# Altium footprint library LukaLIBRARY.PcbLib: 784 footprints (part 30 of 49)
Each footprint in its own frame and in the unit in brackets; x right, y up, seen from the top. Pads: shape width x height; smd on the part's side, far side on the other; paste and mask are expansions set on the pad; w line width, h text height; cw(c..) or ccw(c..) is an arc to the next point about the centre after c.
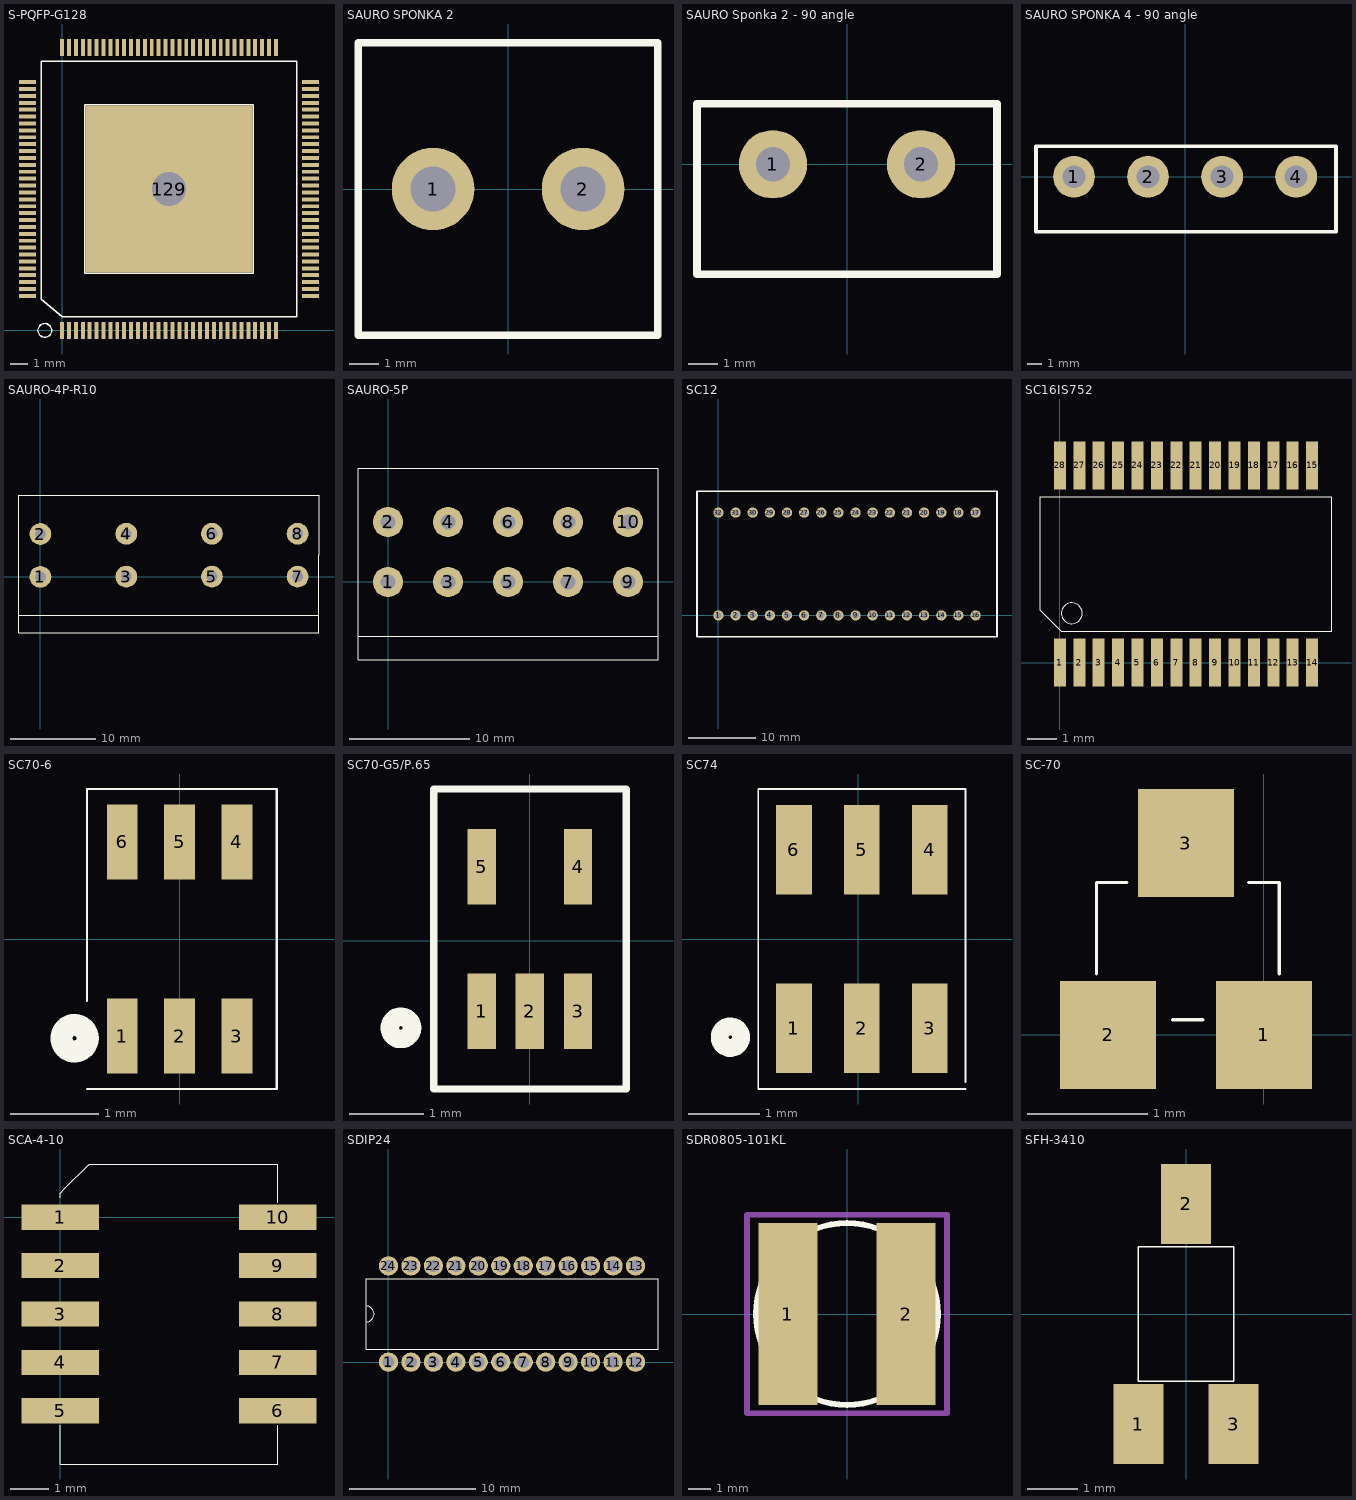
[diagram p29: the footprints below, top view; thin cyan lines are the x and y axes]

## S-PQFP-G128 [mm]
pads (129):
  rect 0.229x1 smd mask-25.4: 1(0,0) 2(0.4,0) 3(0.8,0) 4(1.2,0) 5(1.6,0) 6(2,0) 7(2.4,0) 8(2.8,0) 9(3.2,0) 10(3.6,0) 11(4,0) 12(4.4,0) 13(4.8,0) 14(5.2,0) 15(5.6,0) 16(6,0) 17(6.4,0) 18(6.8,0) 19(7.2,0) 20(7.6,0) 21(8,0) 22(8.4,0) 23(8.8,0) 24(9.2,0) 25(9.6,0) 26(10,0) 27(10.4,0) 28(10.8,0) 29(11.2,0) 30(11.6,0) 31(12,0) 32(12.4,0) 65(12.4,16.4) 66(12,16.4) 67(11.6,16.4) 68(11.2,16.4) 69(10.8,16.4) 70(10.4,16.4) 71(10,16.4) 72(9.6,16.4) 73(9.2,16.4) 74(8.8,16.4) 75(8.4,16.4) 76(8,16.4) 77(7.6,16.4) 78(7.2,16.4) 79(6.8,16.4) 80(6.4,16.4) 81(6,16.4) 82(5.6,16.4) 83(5.2,16.4) 84(4.8,16.4) 85(4.4,16.4) 86(4,16.4) 87(3.6,16.4) 88(3.2,16.4) 89(2.8,16.4) 90(2.4,16.4) 91(2,16.4) 92(1.6,16.4) 93(1.2,16.4) 94(0.8,16.4) 95(0.4,16.4) 96(0,16.4)
  rect 1x0.229 smd mask-25.4: 33(14.4,2) 34(14.4,2.4) 35(14.4,2.8) 36(14.4,3.2) 37(14.4,3.6) 38(14.4,4) 39(14.4,4.4) 40(14.4,4.8) 41(14.4,5.2) 42(14.4,5.6) 43(14.4,6) 44(14.4,6.4) 45(14.4,6.8) 46(14.4,7.2) 47(14.4,7.6) 48(14.4,8) 49(14.4,8.4) 50(14.4,8.8) 51(14.4,9.2) 52(14.4,9.6) 53(14.4,10) 54(14.4,10.4) 55(14.4,10.8) 56(14.4,11.2) 57(14.4,11.6) 58(14.4,12) 59(14.4,12.4) 60(14.4,12.8) 61(14.4,13.2) 62(14.4,13.6) 63(14.4,14) 64(14.4,14.4) 97(-2,14.4) 98(-2,14) 99(-2,13.6) 100(-2,13.2) 101(-2,12.8) 102(-2,12.4) 103(-2,12) 104(-2,11.6) 105(-2,11.2) 106(-2,10.8) 107(-2,10.4) 108(-2,10) 109(-2,9.6) 110(-2,9.2) 111(-2,8.8) 112(-2,8.4) 113(-2,8) 114(-2,7.6) 115(-2,7.2) 116(-2,6.8) 117(-2,6.4) 118(-2,6) 119(-2,5.6) 120(-2,5.2) 121(-2,4.8) 122(-2,4.4) 123(-2,4) 124(-2,3.6) 125(-2,3.2) 126(-2,2.8) 127(-2,2.4) 128(-2,2)
  rect 9.7x9.7 hole 2 unplated mask-25.4: 129(6.2,8.2)
Top Overlay:
  circle w0.076: c-1,0 r0.4
  lines w0.076: -1.2,1.8 0,0.8 13.6,0.8 13.6,15.6 -1.2,15.6 -1.2,1.8 ; 1.3,3.3 1.3,13.1 11.1,13.1 11.1,3.3 1.3,3.3
Top Solder:
  drawing of 129 lines, arcs and shapes, not listed
Bottom Solder:
  region: 8.2,10.2 4.2,10.2 4.2,6.2 8.2,6.2

## SAURO SPONKA 2 [mil]
pads (2):
  round 110 hole 60: 1(-100,0) 2(100,0)
Top Overlay:
  lines w10: -200,-195 -200,195 200,195 200,-195 -200,-195

## SAURO Sponka 2 - 90 angle [mil]
pads (2):
  round 90 hole 45: 1(-97.5,0) 2(97.5,0)
Top Overlay:
  lines w10: -197.5,-145 197.5,-145 197.5,80 -197.5,80 -197.5,-145

## SAURO SPONKA 4 - 90 angle [mil]
pads (4):
  round 110 hole 60: 1(-292.5,0) 2(-97.5,0) 3(97.5,0) 4(292.5,0)
Top Overlay:
  lines w10: -392.5,-145 397.5,-145 397.5,80 -392.5,80 -392.5,-145

## SAURO-4P-R10 [mm]
pads (8):
  round 2.54 hole 1.27 mask-25.4: 1(0,0) 2(0,5) 3(10.031,0.031) 4(10.031,5.031) 5(20.031,0.031) 6(20.031,5.031) 7(30.031,0.031) 8(30.031,5.031)
Top Overlay:
  lines w0.1: 32.5,2.5 32.5,-4.5 ; 32.532,2.531 32.5,9.5 -2.5,9.5 -2.5,-4.5 ; -2.5,-4.5 -2.5,-6.5 32.5,-6.5 32.5,-4.5 ; -2.5,-4.5 32.5,-4.5
Top Solder:
  drawing of 8 lines, arcs and shapes, not listed
Bottom Solder:
  drawing of 8 lines, arcs and shapes, not listed

## SAURO-5P [mm]
pads (10):
  round 2.54 hole 1.27 mask-25.4: 1(0,0) 2(0,5) 3(5,0) 4(5,5) 5(10,0) 6(10,5) 7(15,0) 8(15,5) 9(20,0) 10(20,5)
Top Overlay:
  lines w0.1: -2.5,-4.5 22.5,-4.5 ; -2.5,-4.5 -2.5,9.5 22.5,9.5 22.5,2.5 22.5,-4.5 ; -2.5,-4.5 -2.5,-6.5 22.5,-6.5 22.5,-4.5
Top Solder:
  drawing of 10 lines, arcs and shapes, not listed
Bottom Solder:
  drawing of 10 lines, arcs and shapes, not listed

## SC12 [mil]
pads (32):
  round 60 hole 38: 1(0,0) 2(100,0) 3(200,0) 4(300,0) 5(400,0) 6(500,0) 7(600,0) 8(700,0) 9(800,0) 10(900,0) 11(1000,0) 12(1100,0) 13(1200,0) 14(1300,0) 15(1400,0) 16(1500,0) 17(1500,600) 18(1400,600) 19(1300,600) 20(1200,600) 21(1100,600) 22(1000,600) 23(900,600) 24(800,600) 25(700,600) 26(600,600) 27(500,600) 28(400,600) 29(300,600) 30(200,600) 31(100,600) 32(0,600)
Top Overlay:
  lines w10: -125,-125 -125,725 1625,725 1625,-125 -125,-125

## SC16IS752 [mm]
pads (28):
  rect 0.4x1.6 smd: 1(0,0) 2(0.65,0) 3(1.3,0) 4(1.95,0) 5(2.6,0) 6(3.25,0) 7(3.9,0) 8(4.55,0) 9(5.2,0) 10(5.85,0) 11(6.5,0) 12(7.15,0) 13(7.8,0) 14(8.45,0) 15(8.45,6.6) 16(7.8,6.6) 17(7.15,6.6) 18(6.5,6.6) 19(5.85,6.6) 20(5.2,6.6) 21(4.55,6.6) 22(3.9,6.6) 23(3.25,6.6) 24(2.6,6.6) 25(1.95,6.6) 26(1.3,6.6) 27(0.65,6.6) 28(0,6.6)
Top Overlay:
  circle w0.025: c0.4,1.65 r0.35
  lines w0.025: -0.65,1.75 0.05,1.05 9.1,1.05 9.1,5.55 -0.65,5.55 -0.65,1.75

## SC70-6 [mm]
pads (6):
  rect 0.35x0.85 smd mask-25.4: 1(-0.65,-1.1) 2(0,-1.1) 3(0.65,-1.1) 4(0.65,1.1) 5(0,1.1) 6(-0.65,1.1)
Top Overlay:
  circle w0.25: c-1.19,-1.125 r0.15
  lines w0.025: -1.05,-1.7 1.1,-1.7 1.1,1.7 -1.05,1.7 -1.05,-0.7
Top Solder:
  region: -0.475,-1.525 -0.475,-0.675 -0.825,-0.675 -0.825,-1.525
  region: 0.175,-1.525 0.175,-0.675 -0.175,-0.675 -0.175,-1.525
  region: 0.825,-1.525 0.825,-0.675 0.475,-0.675 0.475,-1.525
  region: 0.825,0.675 0.825,1.525 0.475,1.525 0.475,0.675
  region: 0.175,0.675 0.175,1.525 -0.175,1.525 -0.175,0.675
  region: -0.475,0.675 -0.475,1.525 -0.825,1.525 -0.825,0.675

## SC70-G5/P.65 [mil]
pads (5):
  rect 15x40 smd: 1(-25.59,-37.4) 2(0,-37.4) 3(25.59,-37.4) 4(25.59,39.37) 5(-25.59,39.37)
Top Overlay:
  circle w9.84: c-68.5,-46.26 r5.91
  lines w3.94: -51.18,-78.74 51.18,-78.74 51.18,80.71 -51.18,80.71 -51.18,-78.74

## SC74 [mm]
pads (6):
  rect 0.5x1.25 smd mask-25.4: 1(-0.9,-1.25) 2(0.05,-1.25) 3(1,-1.25) 4(1,1.25) 5(0.05,1.25) 6(-0.9,1.25)
Top Overlay:
  circle w0.25: c-1.79,-1.375 r0.15
  lines w0.025: 1.5,-2.1 -1.4,-2.1 -1.4,2.1 1.5,2.1 1.5,-2
Top Solder:
  region: -0.65,0.625 -0.65,1.875 -1.15,1.875 -1.15,0.625
  region: -0.65,-1.875 -0.65,-0.625 -1.15,-0.625 -1.15,-1.875
  region: 0.3,0.625 0.3,1.875 -0.2,1.875 -0.2,0.625
  region: 1.25,0.625 1.25,1.875 0.75,1.875 0.75,0.625
  region: 1.25,-1.875 1.25,-0.625 0.75,-0.625 0.75,-1.875
  region: 0.3,-1.875 0.3,-0.625 -0.2,-0.625 -0.2,-1.875

## SC-70 [mm]
pads (3):
  rect 0.8x0.9 smd: 1(0,0) 2(-1.3,0) 3(-0.65,1.6)
Top Overlay:
  lines w0.025: -1.397,0.508 -1.397,1.27 -1.143,1.27 ; -0.762,0.127 -0.508,0.127 ; -0.127,1.27 0.127,1.27 0.127,0.508

## SCA-4-10 [mil]
pads (10):
  rect 80x26 smd mask-1000: 1(0,0) 2(0,-50) 3(0,-100) 4(0,-150) 5(0,-200) 6(225,-200) 7(225,-150) 8(225,-100) 9(225,-50) 10(225,0)
Top Overlay:
  lines w0.39: 0,-215 0,-255 225,-255 225,-215 ; 0,20 0,25 5,30 30,55 225,55 225,15
Top Solder:
  region: 185,-213 265,-213 265,-187 185,-187
  region: 185,-163 265,-163 265,-137 185,-137
  region: 185,-63 265,-63 265,-37 185,-37
  region: 185,-13 265,-13 265,13 185,13
  region: 185,-113 265,-113 265,-87 185,-87
  region: -40,-163 40,-163 40,-137 -40,-137
  region: -40,-213 40,-213 40,-187 -40,-187
  region: -40,-13 40,-13 40,13 -40,13
  region: -40,-63 40,-63 40,-37 -40,-37
  region: -40,-113 40,-113 40,-87 -40,-87

## SDIP24 [mil]
pads (24):
  round 60 hole 38: 1(0,0) 2(70,0) 3(140,0) 4(210,0) 5(280,0) 6(350,0) 7(420,0) 8(490,0) 9(560,0) 10(630,0) 11(700,0) 12(770,0) 13(770,300) 14(700,300) 15(630,300) 16(560,300) 17(490,300) 18(420,300) 19(350,300) 20(280,300) 21(210,300) 22(140,300) 23(70,300) 24(0,300)
Top Overlay:
  lines w1: -70,125 ccw(c-70,150) -70,175 ; -70,40 -70,260 840,260 840,40 -70,40

## SDR0805-101KL [mm] "SMD Power Inductor"
pads (2):
  rect 2.6x8 smd: 1(-2.6,0) 2(2.6,0)
Top Overlay:
  circle w0.254: c0,0 r4
Mechanical 15:
  lines w0.254: -4.394,-4.369 -4.394,4.369 4.394,4.369 4.394,-4.369 -4.394,-4.369

## SFH-3410 [mm]
pads (3):
  rect 1x1.6 smd mask-25.4: 1(-0.95,-2.2) 2(0,2.2) 3(0.95,-2.2)
Top Overlay:
  lines w0.03: -0.95,-1.35 -0.95,1.35 0.95,1.35 0.95,-1.35 -0.95,-1.35
Top Solder:
  region: -0.5,1.4 0.5,1.4 0.5,3 -0.5,3
  region: -1.45,-3 -0.45,-3 -0.45,-1.4 -1.45,-1.4
  region: 0.45,-3 1.45,-3 1.45,-1.4 0.45,-1.4